# Altium integrated library u025Library.IntLib: 74 symbols
Pins are listed as number, name and electrical type; pins without a type are passive.

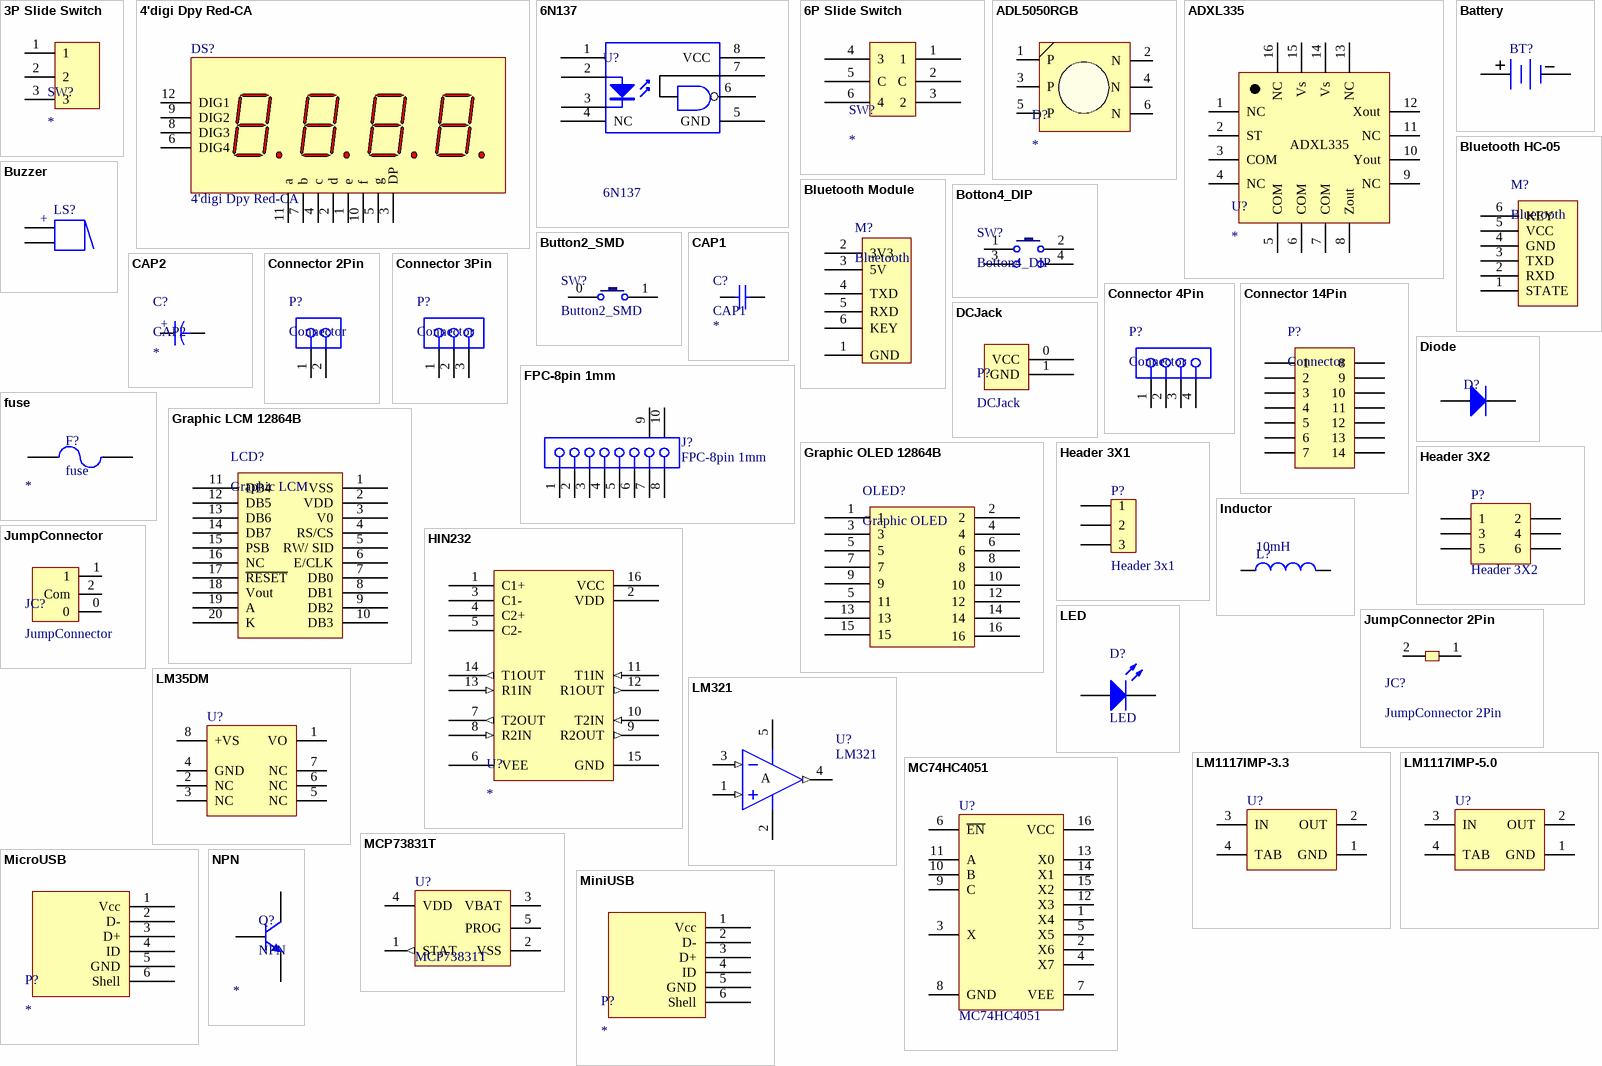
[diagram p0: symbols 3P Slide Switch to NPN]

## 3P Slide Switch
designator SW?
3Pin Slide Switch
footprint 3P_Smooth_Switch_180
footprint 3P_Smooth_Switch_90
pins: 1, 2, 3

## 4'digi Dpy Red-CA
designator DS?
7.62 mm Black Surface HER 7-Segment Display: CA, RH DP; MinimumIntensity: 360 ucd; Note: IF = 5 mA; Colour: High Efficiency Red (HER); Note: Pins 1 and 6 are redundant Anodes.; Published: 8-Jun-2000; LatestRevisionDate: 17-Dec-2003; LatestRevisionNote: Schematic revised, PCB Footprint replaced.; DatasheetVersion: 19-Feb-2002; PackageVersion: 11-Feb-2002; PackageReference: A; Publisher: Altium Limited; PackageDescription: LED, 7-Segment Display, 7.62 mm, RHD; 10 Leads; Row Space 5.08 mm; Pitch 2.54 mm; ComponentLink1Description: Manufacturer Link; ComponentLink1URL: http://www.agilent.com/
footprint 4'digi Dpy Red-CA 3461 0.36' (4-Digi LED, 7-Segment Display)
pins: 1 e "Cathode", 2 d "Cathode", 3 DP "Cathode", 4 c "Cathode", 5 g "Cathode", 6 DIG4 "Cathode", 7 b "Cathode", 8 DIG3 "Cathode", 9 DIG2 "Cathode", 10 f "Cathode", 11 a "Cathode", 12 DIG1 "Cathode"

## 6N137
designator U?
8 PIN HIGH SPEED 10MBit/s LOGIC GATE  PHOTOCOUPLER
footprint BESOP-8 (BESOP  8-Leads, Body 6.6x9.76mm, Pitch 2.54mm,)
pins: 1 NC, 2 A, 3 K, 4 NC, 5 GND, 6 14, 7 14, 8 VCC

## 6P Slide Switch
designator SW?
6Pin Slide Switch
footprint 6P_Smooth_Switch_90
footprint 6P_Smooth_Switch_180
pins: 1, 2 C, 3 2, 4 3, 5 C, 6 4

## ADL5050RGB
designator D?
footprint ADL5050RGB
pins: 1 P, 2 N, 3 P, 4 N, 5 P, 6 N

## ADXL335
designator U?
footprint ADXL335
pins: 1 NC, 2 ST, 3 COM, 4 NC, 5 COM, 6 COM, 7 COM, 8 Zout, 9 NC, 10 Yout, 11 NC, 12 Xout, 13 NC, 14 Vs, 15 Vs, 16 NC

## Battery
designator BT?
Multicell Battery; Published: 24-Mar-1999; LatestRevisionDate: 17-Jul-2002; LatestRevisionNote: Re-released for DXP Platform.; PackageReference: BAT-2; Publisher: Altium Limited; PackageDescription: Battery; 2 Leads
footprint BAT-2 (Battery; 2 Leads)
footprint BAT-CR1220 (Battery; CR1220)
pins: 1 +, 2 -

## Bluetooth HC-05
designator M?, comment Bluetooth
Bluetooth Module
footprint Bluetooth HC-05 (Bluetooth Module)
pins: 1 STATE, 2 RXD, 3 TXD, 4 GND, 5 VCC, 6 KEY

## Bluetooth Module
designator M?, comment Bluetooth
Bluetooth Module
footprint Bluetooth Module
pins: 1 GND, 2 3V3, 3 5V, 4 TXD, 5 RXD, 6 KEY

## Botton4_DIP
designator SW?
footprint Botton4_DIP
footprint Botton4_MiniSMD
pins: 1, 2, 3, 4

## Button2_SMD
designator SW?
footprint Button2_SMD
pins: 0, 1

## Buzzer
designator LS?
Magnetic Transducer Buzzer; Published: 24-Mar-1999; LatestRevisionDate: 17-Dec-2003; LatestRevisionNote: Schematic revised, PCB Footprint replaced.; DatasheetVersion: 17-Dec-2003; PackageReference: ABSM-1574; Publisher: Altium Limited; PackageDescription: Magnetic Transducer Buzzer; ComponentLink1Description: Manufacturer Link; ComponentLink1URL: http://www.megastar.com/linecard/buzzmode/index.php
footprint Buzzer DIP
footprint Buzzer SMT Top
footprint Buzzer SMT Side
pins: 1, 2
1 alternate drawing of the same symbol
text: +

## CAP1
designator C?
Capacitor_SMD; Value: *
footprint SMD-C-0603 (Chip, Body 1.6x0.8mm, IPC High Density)
footprint SMD-C-0805 (Chip  , Body 2 x 1.2mm, IPC High Density)
footprint SMD-C-1206 (Chip , Body 3.2x1.6mm, IPC High Density)
footprint Ceramic Capacitor
footprint SMD-C-0402 (Chip, Body 10x0.4mm, IPC High Density)
pins: 1, 2

## CAP2
designator C?
Electrolytic CAP; Value: *
footprint Electrolytic CAP_1
footprint EcCAP_SMD (EcCAP SMD 4x5x5mm)
footprint Tantalum Cap Size A
footprint Tantalum Cap Size B
footprint Tantalum Cap Size C
pins: 1, 2
text: +

## Connector 2Pin
designator P?, comment Connector
Connector 2Pin
footprint JST 2Pin 90 degree (Connector; JST; 2 Position 90)
footprint JST 2Pin 180 degree (Connector; JST; 2 Position 180)
pins: 1, 2

## Connector 3Pin
designator P?, comment Connector
Connector 3Pin
pins: 1, 2, 3

## Connector 4Pin
designator P?, comment Connector
Connector 4Pin
footprint FPC 4pin 1.0mm (Connector; FH12 Series; 4 Position; 1.0mm Spaced Bottom Eccentric Contact)
footprint JST 4Pin 90 degree (Connector; JST; 4 Position 90)
footprint JST 4Pin 180 degree (Connector; JST; 4 Position)
pins: 1, 2, 3, 4

## Connector 14Pin
designator P?, comment Connector
Connector 14Pin
footprint FPC 14pin 0.5mm (Connector; FH12 Series; 14 Position; 0.5mm Spaced Bottom Eccentric Contact)
pins: 1, 2, 3, 4, 5, 6, 7, 8, 9, 10, 11, 12, 13, 14

## DCJack
designator P?
footprint DCJack_1mm
footprint DCJack_2mm
pins: 0 VCC, 1 GND

## Diode
designator D?  (value not drawn)
Model  Number: *
footprint Diode_SMD_SMA
footprint Diode_SMD_MicroSMP
pins: 1 A, 2 K

## FPC-8pin 1mm
designator J?
FH12 Series, "Flip-Lock" SMT/ZIF FFC/FPC Connector - 1.0mm Spaced Bottom Eccentric Contact; Positions: 8; ContactMaterial: Phosphor Bronze; Current: 0.5A; PCB_Layout: Complies with manufacturer's recommendation.; Note: Pad dimensions follow nominal values, Suitable for Wave Soldering, Adjust for Re-flow.; Published: 17-Jul-2002; DatasheetVersion: 13-Nov-2000; PackageVersion: 13-Nov-2000; PackageReference: FH12-18(8)SA-1SH; Publisher: Altium Limited; ComponentLink1Description: Manufacturer Link; ComponentLink1URL: http://www.hiroseusa.com/; ComponentLink2Description: Datasheet; ComponentLink2URL: http://www.hirose.co.jp/cataloge_hp/e58605370.pdf
footprint FH12-18(8)SA-1SH (Connector; FH12 Series; 8 Position; 1.0mm Spaced Bottom Eccentric Contact)
signal-integrity model FH12
pins: 1, 2, 3, 4, 5, 6, 7, 8, 9 MH1, 10 MH2

## fuse
designator F?
Value: *
footprint FUSE_SMD
footprint FUSE_Nano SMF (FUSE Nano SMF)
footprint FUSE CLIP
pins: 1, 2

## Graphic LCM 12864B
designator LCD?, comment Graphic LCM
Graphic LCM 12864B
footprint GraphicLCM12864_20PIN (GraphicLCM12864_20PIN_15mm)
pins: 1 VSS, 2 VDD, 3 V0, 4 RS/CS, 5 RW/ SID, 6 E/CLK, 7 DB0, 8 DB1, 9 DB2, 10 DB3, 11 DB4, 12 DB5, 13 DB6, 14 DB7, 15 PSB, 16 NC, 17 ~{RESET}, 18 Vout, 19 A, 20 K

## Graphic OLED 12864B
designator OLED?, comment Graphic OLED
Graphic OLED 12864
footprint OLED_12864_H2X8 (Connector; Header; 8x2 Position)
pins: 1, 2, 3, 4, 5, 5 11, 6, 7, 8, 9, 10, 12, 13, 14, 15, 16

## Header 3X1
designator P?, comment Header 3x1
Header, 3-Pin, Dual row; LatestRevisionDate: 17-Jul-2002; LatestRevisionNote: Re-released for DXP Platform.; Publisher: Altium Limited
footprint HDR3X1 2.0mm (Connector; Header; 31 Position 2.0mm)
pins: 1, 2, 3

## Header 3X2
designator P?
Header, 3-Pin, Dual row; LatestRevisionDate: 17-Jul-2002; LatestRevisionNote: Re-released for DXP Platform.; Publisher: Altium Limited
signal-integrity model Connector
footprint HDR2X3 2.0mm (Connector; Header; 3x2 Position 2.0mm)
pins: 1, 2, 3, 4, 5, 6

## HIN232
designator U?
footprint DIP_IC_16
pins: 1 C1+, 2 VDD, 3 C1-, 4 C2+, 5 C2-, 6 VEE, 7 T2OUT (out), 8 R2IN (in), 9 R2OUT (out), 10 T2IN (in), 11 T1IN (in), 12 R1OUT (out), 13 R1IN (in), 14 T1OUT (out), 15 GND, 16 VCC

## Inductor
designator L?  value 10mH
Inductor; Code_IEC: 1005; Published: 8-Jun-2000; LatestRevisionDate: 29-May-2009; LatestRevisionNote: IPC-7351 Footprint Added.; PackageReference: 0402-A; Publisher: Altium Limited; PackageDescription: Chip Inductor; Code_JEITA: 0402
footprint INDC1608L (Chip Inductor, Body 1.6x0.8mm, IPC High Density)
footprint INDC3216 (Chip Inductor, Body 3.2x1.6mm, IPC High Density)
footprint INDC4532 (Chip Inductor, Body 4.5x3.2mm, IPC High Density)
simulation model INDUCTOR (Inductor)
signal-integrity model Inductor
footprint SMD-L-1210
pins: 1, 2

## JumpConnector
designator JC?
footprint JumpConnector_Pad (JumpConnector SMD Pad Only)
footprint JumpConnector_Dip254 (JumpConnector Hold 2.54mm)
pins: 0, 1, 2 Com

## JumpConnector 2Pin
designator JC?
JumpConnector
footprint JumpConnector2P_Dip (JumpConnector Hold 2.54mm)
footprint JumpConnector2P_Pad (JumpConnector SMD Pad Only)
pins: 1, 2 Com

## LED
designator D?
Typical RED GaAs LED; Published: 8-Jun-2000; LatestRevisionDate: 08-Jul-2005; LatestRevisionNote: Mech Layer 1 removed.; PackageReference: LED-1; Publisher: Altium Limited; PackageDescription: LED; 2 Leads
footprint SMT LED 0603 (SMT LED; 2 Flat Leads)
footprint SMT LED 0805 (SMT LED; 2 Flat Leads)
footprint SMT LED 1206 (SMT LED; 2 Flat Leads)
footprint LED_DIP_3mm
footprint LED_DIP_5mm
pins: 1 A, 2 K

## LM35DM
designator U?
Precision Centigrade Temperature Sensor; PartNumber: LM35DM; Manufacturer: National Semiconductor; CompType: Temp Sensor IC; PackageTopMarking: NSZXTT*LM35D*M; PowerWise: N; Published: 4-Dec-2008; DatasheetVersion: Nov-2000; PackageVersion: revL, Sep-2006; PackageReference: M08A; Publisher: Altium Limited; PackageDescription: SOIC Narrow, 4.9 x 3.9 x 1.45mm, 8 Lead, 1.27mm Pitch; RoHS: O; PinCount: 8; DigiKeyPartNumber: LM35DM-ND; Code_JEDEC: MS-012-AA; Code_IPC: SOIC127P600-8; ComponentLink1Description: LM35 Datasheet; ComponentLink1URL: http://www.national.com/ds/LM/LM35.pdf; ComponentLink2Description: LM35 Web Page; ComponentLink2URL: http://www.national.com/pf/LM/LM35.html; ComponentLink3Description: M08A Package Page; ComponentLink3URL: http://www.national.com/packaging/folders/m08a.html
footprint SOIC8N_M (SOIC, 8-Leads, Body 4.9x3.9mm, Pitch 1.27mm, IPC Low Density)
pins: 1 VO, 2 NC "Not Connected", 3 NC, 4 GND (power), 5 NC, 6 NC, 7 NC, 8 +VS

## LM321
designator U?
Single Operational Amplifier; Published: 16-Jan-2001; LatestRevisionDate: 13-Apr-2006; LatestRevisionNote: IPC-7351 Footprint Added.; DatasheetVersion: Jul-1998; PackageVersion: Jan-1998; PackageReference: D008; Publisher: Altium Limited; PackageDescription: 8-Pin Small Outline Integrated Circuit 1.27 mm Pitch; Code_IPC: SOIC127P600-8; ComponentLink1Description: Manufacturer Link; ComponentLink1URL: http://www.ti.com/; ComponentLink2Description: Datasheet; ComponentLink2URL: http://www-s.ti.com/sc/ds/lm2904.pdf
footprint SOT23-5_N (SOT23, 5-Leads, Body 2.9x1.6mm, Pitch 0.95mm, Lead Span 2.8mm, IPC Medium Density)
pins: 1 IN+ (in), 2 V- (power), 3 IN- (in), 4 OUT (out), 5 V+ (power)
text: A

## LM1117IMP-3.3
designator U?
800mA Low-Dropout Linear Regulator; PartNumber: LM1117IMP-3.3; Manufacturer: National Semiconductor; CompType: LDO IC; PackageTopMarking: XYTT*N05B; PowerWise: N; Published: 4-Dec-2008; DatasheetVersion: Apr-2006; PackageVersion: revB, Apr-2003; PackageReference: MP04A; Publisher: Altium Limited; PackageDescription: Molded SOT-223, 6.50 x 3.56 x 1.6mm Body, 4 Lead, 2.3mm Pitch; RoHS: O; PinCount: 4; DigiKeyPartNumber: LM1117IMP-3.3CT-ND; Code_JEDEC: TO-261-AA; Code_IPC: SOT223-4; ComponentLink1Description: LM1117 Datasheet; ComponentLink1URL: http://www.national.com/ds/LM/LM1117.pdf; ComponentLink2Description: LM1117 Web Page; ComponentLink2URL: http://www.national.com/pf/LM/LM1117.html; ComponentLink3Description: MP04A Package Page; ComponentLink3URL: http://www.national.com/packaging/folders/mp04a.html
footprint MP04A_N (SOT223, 4-Leads, Body 6.5x3.5mm, Pitch 2.3mm, Lead Span 7mm, IPC Medium Density)
footprint MP04A_L (SOT223, 4-Leads, Body 6.5x3.5mm, Pitch 2.3mm, Lead Span 7mm, IPC High Density)
footprint MP04A_M (SOT223, 4-Leads, Body 6.5x3.5mm, Pitch 2.3mm, Lead Span 7mm, IPC Low Density)
pins: 1 GND (power), 2 OUT (power), 3 IN (power), 4 TAB (power)

## LM1117IMP-5.0
designator U?
800mA Low-Dropout Linear Regulator; PartNumber: LM1117IMP-5.0; Manufacturer: National Semiconductor; CompType: LDO IC; PackageTopMarking: XYTT*N06B; PowerWise: N; Published: 4-Dec-2008; DatasheetVersion: Apr-2006; PackageVersion: revB, Apr-2003; PackageReference: MP04A; Publisher: Altium Limited; PackageDescription: Molded SOT-223, 6.50 x 3.56 x 1.6mm Body, 4 Lead, 2.3mm Pitch; RoHS: O; PinCount: 4; DigiKeyPartNumber: LM1117IMP-5.0CT-ND; Code_JEDEC: TO-261-AA; Code_IPC: SOT223-4; ComponentLink1Description: LM1117 Datasheet; ComponentLink1URL: http://www.national.com/ds/LM/LM1117.pdf; ComponentLink2Description: LM1117 Web Page; ComponentLink2URL: http://www.national.com/pf/LM/LM1117.html; ComponentLink3Description: MP04A Package Page; ComponentLink3URL: http://www.national.com/packaging/folders/mp04a.html
footprint MP04A_N (SOT223, 4-Leads, Body 6.5x3.5mm, Pitch 2.3mm, Lead Span 7mm, IPC Medium Density)
footprint MP04A_L (SOT223, 4-Leads, Body 6.5x3.5mm, Pitch 2.3mm, Lead Span 7mm, IPC High Density)
footprint MP04A_M (SOT223, 4-Leads, Body 6.5x3.5mm, Pitch 2.3mm, Lead Span 7mm, IPC Low Density)
pins: 1 GND (power), 2 OUT (power), 3 IN (power), 4 TAB (power)

## MC74HC4051
designator U?
Analog Multiplexer/Demultiplexer; Published: 17-Jul-2002; LatestRevisionDate: 06-Jun-2005; LatestRevisionNote: Stylized 3D Model Added; DatasheetVersion: Mar-2000; PackageVersion: Mar-2000; PackageReference: 948F-01; Publisher: Altium Limited; PackageDescription: Shrink Small Outline; 16 Leads; Body Width 4.4 mm; Pitch 0.65 mm; ComponentLink1Description: Manufacturer Link; ComponentLink1URL: http://www.onsemi.com/site/products/parametrics/0,4446,47,00.html; ComponentLink2Description: Datasheet; ComponentLink2URL: http://www.onsemi.com/pub/Collateral/MC74HC4051A-D.PDF
footprint TSSOP-16 (Shrink Small Outline; 16 Leads; Body Width 4.4 mm; Pitch 0.65 mm)
pins: 1 X4, 2 X6, 3 X, 4 X7, 5 X5, 6 ~{EN}, 7 VEE (power), 8 GND (power), 9 C, 10 B, 11 A, 12 X3, 13 X0, 14 X1, 15 X2, 16 VCC (power)

## MCP73831T
designator U?
LatestRevisionDate: 17-Jul-2002; LatestRevisionNote: Re-released for DXP Platform.; Publisher: Altium Limited
footprint SOT23-5_L
footprint SOT23-5_M (SOT23, 5-Leads, Body 2.9x1.6mm, Pitch 0.95mm, Lead Span 2.8mm, IPC Low Density)
footprint SOT23-5_N (SOT23, 5-Leads, Body 2.9x1.6mm, Pitch 0.95mm, Lead Span 2.8mm, IPC Medium Density)
pins: 1 STAT (out), 2 VSS, 3 VBAT, 4 VDD, 5 PROG

## MicroUSB
designator P?
MicroUSB
footprint MicroUSB
pins: 1 Vcc, 2 D-, 3 D+, 4 ID, 5 GND, 6 Shell

## MiniUSB
designator P?
MiniUSB include Data Pin
footprint MiniUSB_SMD
pins: 1 Vcc, 2 D-, 3 D+, 4 ID, 5 GND, 6 Shell

## NPN
designator Q?
NPN Trasister; Model  Number: *
footprint SOT-23 - S8050 (SOT-23 for S8050)
footprint SOT-23
pins: 1 E, 2 B, 3 C

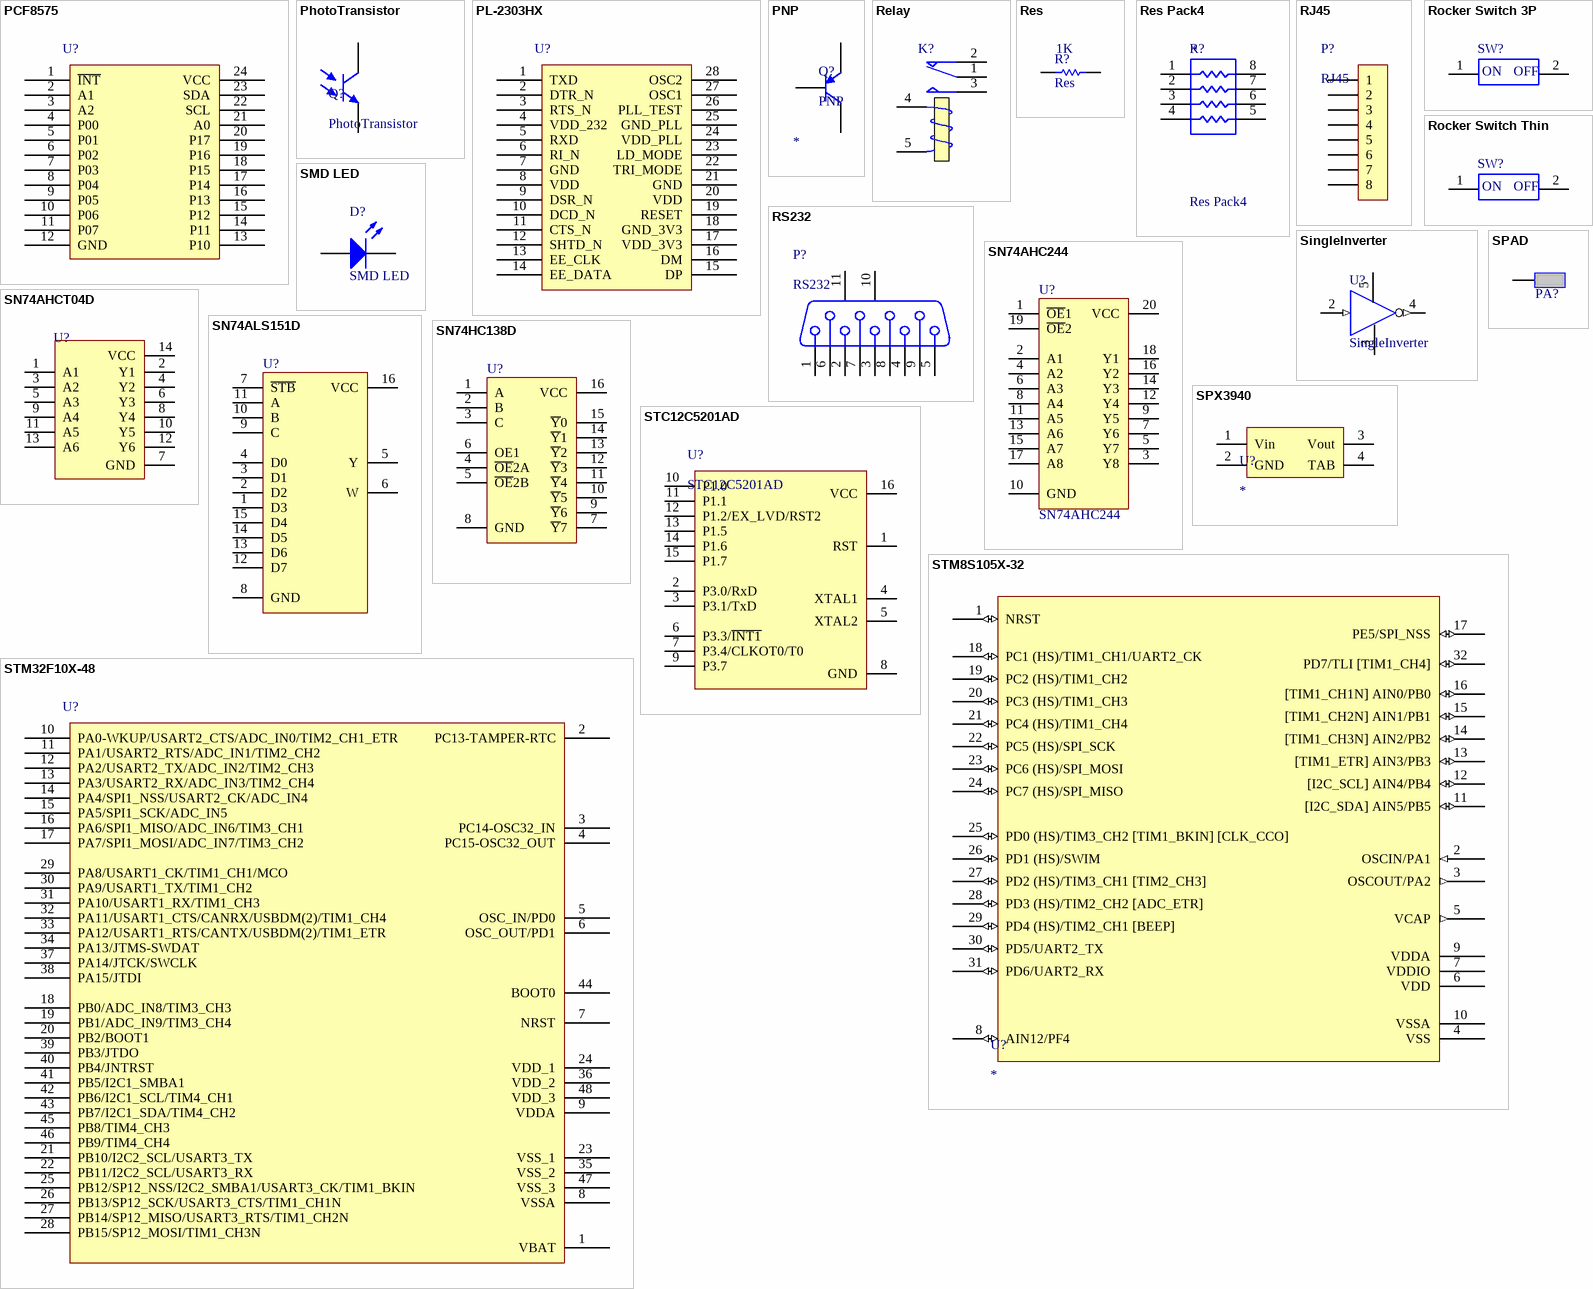
[diagram p1: symbols PCF8575 to STM32F10X-48]

## PCF8575
designator U?
Prolific PL-2303HX USB to Serial Bridge Controller, SSOP28; Published: 30-May-2008; DatasheetVersion: rev6, Mar-2008; PackageVersion: Mar-2008; PackageReference: LQFP48; Publisher: Altium Limited; PackageDescription: 48-Pin Low-Profile Quad Flat Pack, 7 x 7 mm Body, 0.5 mm Pitch (LQFP48); ComponentLink1Description: Manufacturer Link; ComponentLink1URL: www.st.com/stm32; ComponentLink2Description: Datasheet; ComponentLink2URL: http://www.st.com/stonline/products/literature/ds/13587.pdf
footprint SSOP24_N (SOP, 28-Leads, Body 10.2x5.3mm, Pitch 0.65mm, IPC Medium Density)
pins: 1 ~{INT}, 2 A1, 3 A2, 4 P00, 5 P01, 6 P02, 7 P03, 8 P04, 9 P05, 10 P06, 11 P07, 12 GND, 13 P10, 14 P11, 15 P12, 16 P13, 17 P14, 18 P15, 19 P16, 20 P17, 21 A0, 22 SCL, 23 SDA, 24 VCC

## PhotoTransistor
designator Q?
footprint PhotoTransistor
pins: 0 C, 1 E

## PL-2303HX
designator U?
Prolific PL-2303HX USB to Serial Bridge Controller, SSOP28; Published: 30-May-2008; DatasheetVersion: rev6, Mar-2008; PackageVersion: Mar-2008; PackageReference: LQFP48; Publisher: Altium Limited; PackageDescription: 48-Pin Low-Profile Quad Flat Pack, 7 x 7 mm Body, 0.5 mm Pitch (LQFP48); ComponentLink1Description: Manufacturer Link; ComponentLink1URL: www.st.com/stm32; ComponentLink2Description: Datasheet; ComponentLink2URL: http://www.st.com/stonline/products/literature/ds/13587.pdf
footprint SSOP28_N (SOP, 28-Leads, Body 10.2x5.3mm, Pitch 0.65mm, IPC Medium Density)
pins: 1 TXD, 2 DTR_N, 3 RTS_N, 4 VDD_232, 5 RXD, 6 RI_N, 7 GND, 8 VDD, 9 DSR_N, 10 DCD_N, 11 CTS_N, 12 SHTD_N, 13 EE_CLK, 14 EE_DATA, 15 DP, 16 DM, 17 VDD_3V3, 18 GND_3V3, 19 RESET, 20 VDD, 21 GND, 22 TRI_MODE, 23 LD_MODE, 24 VDD_PLL, 25 GND_PLL, 26 PLL_TEST, 27 OSC1, 28 OSC2

## PNP
designator Q?
PNP Trasister; Model  Number: *
footprint SOT-23
footprint SOT-23 - S8550
pins: 1 C, 2 B, 3 E

## Relay
designator K?
SPDT Relay; Published: 8-Jun-2000; LatestRevisionDate: 17-Jul-2002; LatestRevisionNote: Re-released for DXP Platform.; PackageReference: MODULE5B; Publisher: Altium Limited
footprint Relay_5vDC_833H
pins: 1 COM, 2 NC, 3 NO, 4 T1, 5 T2

## Res
designator R?  value 1K
Resistor; Published: 8-Jun-2000; LatestRevisionDate: 17-Jul-2002; LatestRevisionNote: Re-released for DXP Platform.; PackageReference: AXIAL-0.3; Publisher: Altium Limited; PackageDescription: Axial Device, Thru-Hole; 2 Leads; 0.3 in Pin Spacing
footprint SMD-R-0603 (Chip, Body 1.6x0.8mm, IPC High Density)
footprint SMD-R-0805 (Chip  , Body 2 x 1.2mm, IPC High Density)
footprint SMD-R-1206 (Chip , Body 3.2x1.6mm, IPC High Density)
footprint SMD-R-0402 (Chip, Body 10x0.4mm, IPC High Density)
pins: 1, 2
